# Altium footprint library TranDangKhoa-LIB.PcbLib: 1435 footprints (part 88 of 90)
Each footprint in its own frame and in the unit in brackets; x right, y up, seen from the top. Pads: shape width x height; smd on the part's side, far side on the other; paste and mask are expansions set on the pad; w line width, h text height; cw(c..) or ccw(c..) is an arc to the next point about the centre after c.
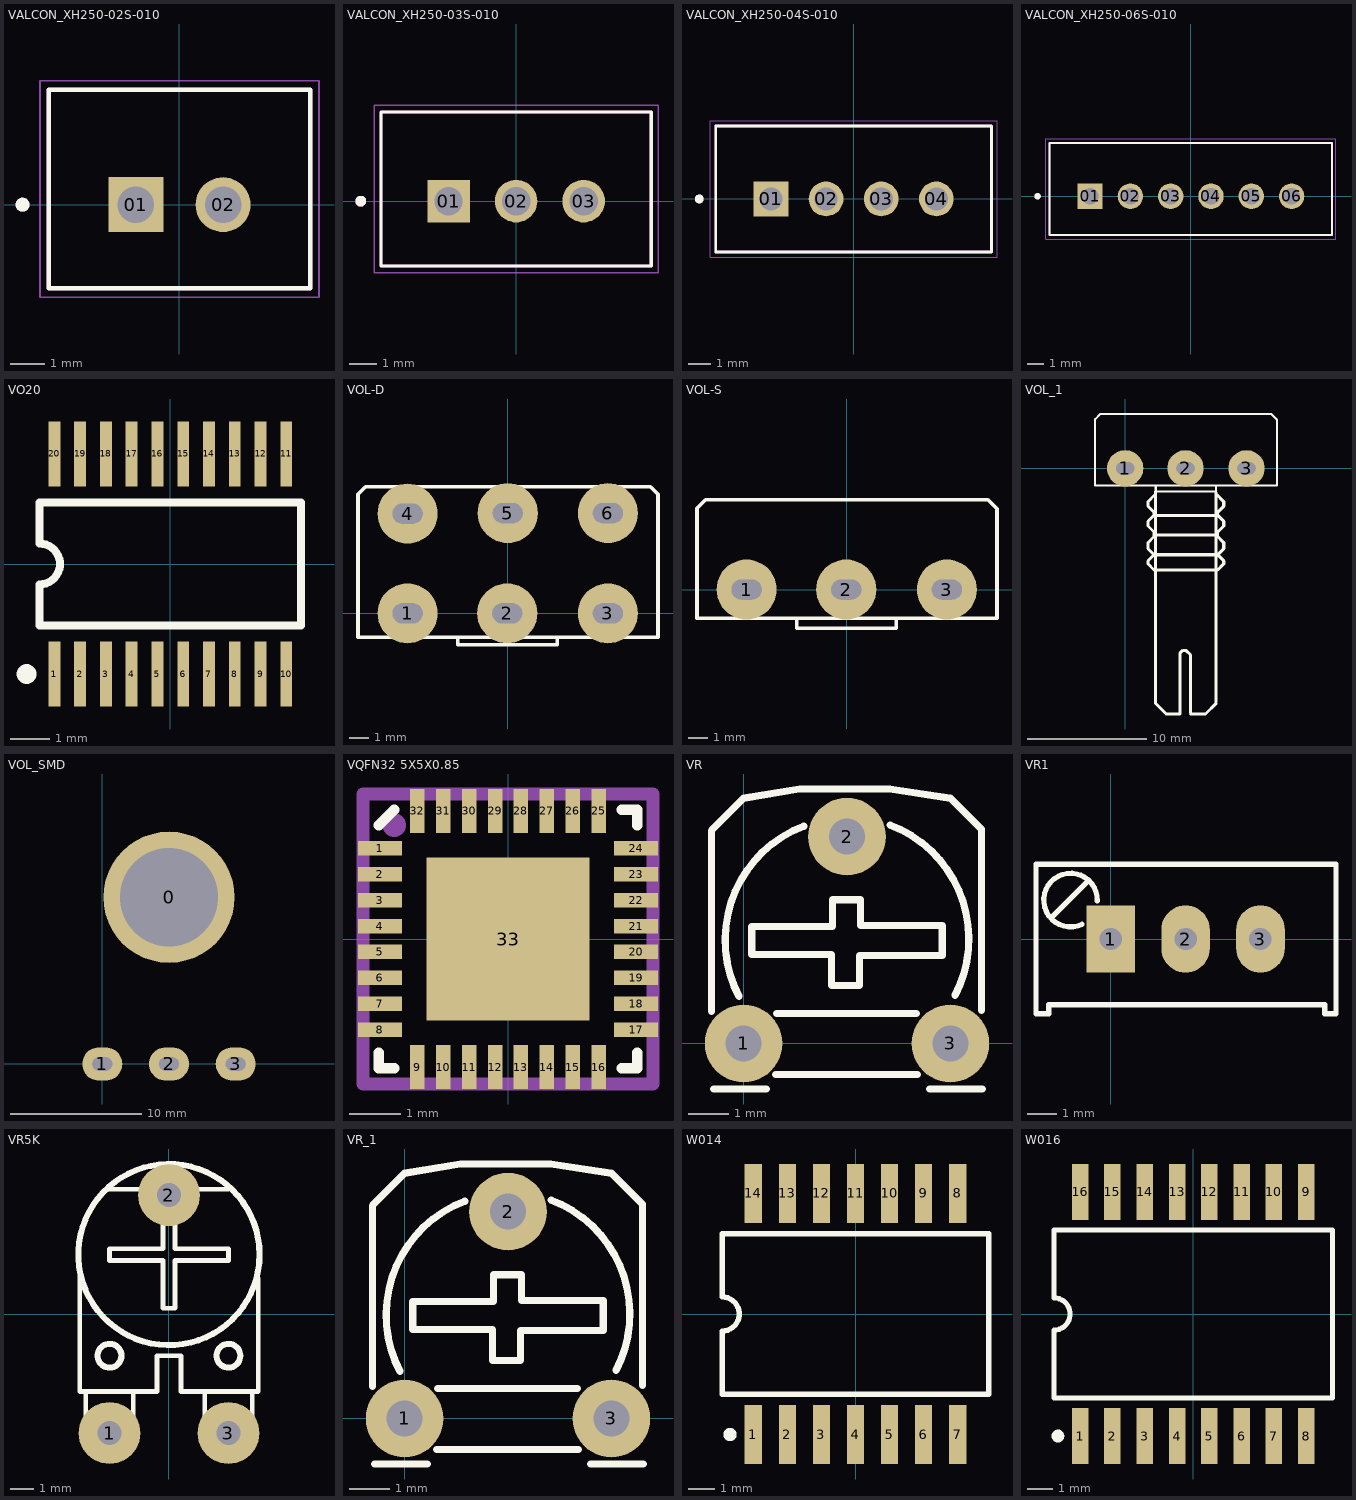
[diagram p87: the footprints below, top view; thin cyan lines are the x and y axes]

## VALCON_XH250-02S-010 [mm]
height 7
pads (2):
  rect 1.575x1.575 / inner round 1.575 / far side rect 1.575x1.575 hole 1.05: 01(-1.25,0)
  round 1.575 hole 1.05: 02(1.25,0)
Top Overlay:
  circle w0.2: c-4.5,0 r0.1
  lines w0.127: -3.75,-2.4 -3.75,3.3 3.75,3.3 3.75,-2.4 -3.75,-2.4
Mechanical 13:
  circle w0.2: c-4.5,0 r0.1
  lines w0.127: -3.75,-2.4 -3.75,3.3 3.75,3.3 3.75,-2.4 -3.75,-2.4
Mechanical 15:
  lines w0.05: -4,-2.65 -4,3.55 4,3.55 4,-2.65 -4,-2.65
3D body "step_temp.STEP": height 7, standoff -3.4, extent -3.75,-2.4 3.75,3.3

## VALCON_XH250-03S-010 [mm]
pads (3):
  rect 1.575x1.575 / inner round 1.575 / far side rect 1.575x1.575 hole 1.05 mask+0.05: 01(-2.5,0)
  round 1.575 hole 1.05 mask+0.05: 02(0,0) 03(2.5,0)
Top Overlay:
  circle w0.2: c-5.75,0 r0.1
  lines w0.127: -5,-2.4 -5,3.3 5,3.3 5,-2.4 -5,-2.4
Mechanical 13:
  circle w0.2: c-5.75,0 r0.1
  lines w0.127: -5,-2.4 -5,3.3 5,3.3 5,-2.4 -5,-2.4
Mechanical 15:
  lines w0.05: -5.25,-2.65 -5.25,3.55 5.25,3.55 5.25,-2.65 -5.25,-2.65

## VALCON_XH250-04S-010 [mm]
pads (4):
  rect 1.575x1.575 / inner round 1.575 / far side rect 1.575x1.575 hole 1.05 mask+0.05: 01(-3.75,0)
  round 1.575 hole 1.05 mask+0.05: 02(-1.25,0) 03(1.25,0) 04(3.75,0)
Top Overlay:
  circle w0.2: c-7,0 r0.1
  lines w0.127: -6.25,-2.4 -6.25,3.3 6.25,3.3 6.25,-2.4 -6.25,-2.4
Mechanical 13:
  circle w0.2: c-7,0 r0.1
  lines w0.127: -6.25,-2.4 -6.25,3.3 6.25,3.3 6.25,-2.4 -6.25,-2.4
Mechanical 15:
  lines w0.05: -6.5,-2.65 -6.5,3.55 6.5,3.55 6.5,-2.65 -6.5,-2.65

## VALCON_XH250-06S-010 [mm]
pads (6):
  rect 1.575x1.575 / inner round 1.575 / far side rect 1.575x1.575 hole 1.05: 01(-6.25,0)
  round 1.575 hole 1.05: 02(-3.75,0) 03(-1.25,0) 04(1.25,0) 05(3.75,0) 06(6.25,0)
Top Overlay:
  circle w0.2: c-9.5,0 r0.1
  lines w0.127: -8.75,-2.4 -8.75,3.3 8.75,3.3 8.75,-2.4 -8.75,-2.4
Mechanical 13:
  circle w0.2: c-9.5,0 r0.1
  lines w0.127: -8.75,-2.4 -8.75,3.3 8.75,3.3 8.75,-2.4 -8.75,-2.4
Mechanical 15:
  lines w0.05: -9,-2.65 -9,3.55 9,3.55 9,-2.65 -9,-2.65
3D body "step_temp.STEP": height 7, standoff -3.4, extent -8.75,-2.4 8.75,3.3

## VO20 [mm] "20-Lead TSOP (VO20)"
height 1.2
pads (20):
  rect 0.3x1.65 smd: 1(-2.925,-2.775) 2(-2.275,-2.775) 3(-1.625,-2.775) 4(-0.975,-2.775) 5(-0.325,-2.775) 6(0.325,-2.775) 7(0.975,-2.775) 8(1.625,-2.775) 9(2.275,-2.775) 10(2.925,-2.775) 11(2.925,2.775) 12(2.275,2.775) 13(1.625,2.775) 14(0.975,2.775) 15(0.325,2.775) 16(-0.325,2.775) 17(-0.975,2.775) 18(-1.625,2.775) 19(-2.275,2.775) 20(-2.925,2.775)
Top Overlay:
  circle w0.25: c-3.625,-2.775 r0.125
  lines w0.2: -3.3,-1.55 3.3,-1.55 3.3,1.55 -3.3,1.55 -3.3,0.517 cw(c-3.3,0) -3.3,-0.517 -3.3,-1.55

## VOL-D [mil] "Volume control Dual"
height 400
pads (6):
  round 120 hole 40 slot 60 at 0 deg: 1(-200,0) 2(-1,0) 3(200,0) 4(-200,199) 5(0,200) 6(200,200)
Top Overlay:
  lines w7: -100,-48 -100,-63 99,-63 99,-48 ; -299,-48 300,-48 300,238 285,253 -284,253 -299,238 -299,-48
3D body "SW3dPS-ALPHA-potentiometer stereo PCB mount.STEP": height 834.65, standoff -129.92, extent -338.65,-1309.27 330.65,299

## VOL-S [mil] "Volume control single"
height 400
pads (3):
  round 120 hole 40 slot 60 at 0 deg: 1(-200,0) 2(-1,0) 3(200,0)
Top Overlay:
  lines w7: -100,-57 -100,-77 99,-77 99,-57 ; -299,-57 -299,162 -282,179 282,179 300,161 300,-57 -299,-57

## VOL_1 [mil]
pads (3):
  round 120 hole 40 slot 60 at 0 deg: 1(0,0) 2(199,0) 3(400,0)
Top Overlay:
  lines w7: 100,-57 100,-77 299,-77 299,-57 ; 101,-77 101,-57 ; -99,-57 500,-57 500,161 482,179 -82,179 -99,162 -99,-57
  lines w10: 95,-335 75,-315 75,-305 95,-285 75,-265 75,-245 95,-225 95,-210 75,-190 75,-175 95,-155 95,-145 75,-125 75,-110 100,-85 ; 95,-220 300,-220 ; 100,-770 100,-77 ; 100,-760 100,-775 135,-810 180,-810 180,-610 190,-600 200,-600 215,-615 215,-805 ; 100,-335 305,-335 325,-315 325,-305 305,-285 ; 100,-285 305,-285 ; 105,-155 300,-155 ; 215,-810 265,-810 300,-775 ; 300,-770 300,-80 ; 300,-85 325,-110 325,-125 305,-145 305,-155 325,-175 325,-190 305,-210 305,-225 325,-245 325,-265 305,-285
3D body "SW3dPS-Pot.STEP": height 839.35, standoff -130, extent -110,-818.11 510,188.11

## VOL_SMD [mil]
pads (4):
  round 393.7 hole 295.28: 0(200,500)
  oval 120x100 hole 40 slot 60 at 0 deg: 1(0,0) 2(200,0) 3(400,0)
Bottom Overlay:
  circle w12: c400,150 r50
  circle w12: c200,150 r50
  circle w12: c0,150 r50
  circle w12: c200,500 r215.01
  lines w12: -57.25,301.71 cw(c200,500) 455.57,299.55 ; -55,299 127,299 ; -49,700 119,700 ; 281,298 455,298 ; 286,698 454,698 ; 455,295 500,250 500,-75 -100,-75 -100,255 ; -100,255 -55,300 -100,255
3D body "SW3dPS-omeg pot.STEP": height 866.14, standoff -407.48, extent -203.15,-247.08 600,947.08

## VQFN32 5X5X0.85 [mm] "Creator MM"
pads (33):
  rect 0.85x0.28 smd mask+0.025: 1(-2.475,1.75) 2(-2.475,1.25) 3(-2.475,0.75) 4(-2.475,0.25) 5(-2.475,-0.25) 6(-2.475,-0.75) 7(-2.475,-1.25) 8(-2.475,-1.75) 17(2.475,-1.75) 18(2.475,-1.25) 19(2.475,-0.75) 20(2.475,-0.25) 21(2.475,0.25) 22(2.475,0.75) 23(2.475,1.25) 24(2.475,1.75)
  rect 0.28x0.85 smd mask+0.025: 9(-1.75,-2.475) 10(-1.25,-2.475) 11(-0.75,-2.475) 12(-0.25,-2.475) 13(0.25,-2.475) 14(0.75,-2.475) 15(1.25,-2.475) 16(1.75,-2.475) 25(1.75,2.475) 26(1.25,2.475) 27(0.75,2.475) 28(0.25,2.475) 29(-0.25,2.475) 30(-0.75,2.475) 31(-1.25,2.475) 32(-1.75,2.475)
  rect 3.15x3.15 smd paste-10 mask+0.025: 33(0,0)
Top Overlay:
  lines w0.2: -2.5,-2.2 -2.5,-2.5 -2.2,-2.5 ; -2.5,2.2 -2.2,2.5 ; 2.2,-2.5 2.5,-2.5 2.5,-2.2 ; 2.2,2.5 2.5,2.5 2.5,2.2
Top Paste:
  rectangle: -1.5,0.1 -0.1,1.5
  region: 0.1,1.5 0.1,0.1 1.5,0.1 1.5,1.5
  region: -0.1,-1.5 -0.1,-0.1 -1.5,-0.1 -1.5,-1.5
  region: 1.5,-0.1 0.1,-0.1 0.1,-1.5 1.5,-1.5
Mechanical 16:
  circle w0.254: c-2.2,2.2 r0.1
  lines w0.254: -2.8,-2.8 -2.8,2.8 2.8,2.8 2.8,-2.8 -2.8,-2.8
Mechanical 29:
  text ".Designator" at -0.6,1 h1.2
3D body: height 0.9, standoff 0, extent -2.5,-2.5 2.5,2.5

## VR [mil] "Resistor Variable"
height 200
pads (3):
  round 75 hole 35: 1(0,0) 2(100,200) 3(200,0)
Top Overlay:
  lines w7: -31,31 -31,206 0,237 54,246 141.5,246 200,237 230,207 230,32 ; -29,-44 22,-44 ; -4.35,45.34 cw(c100,100) 58.1,210.1 ; 8,113 8,86 85,86 85,56 112,56 112,85 192,85 192,114 113,114 113,139 86,139 86,113 9,113 ; 31,-30 168,-30 ; 32,29 167,29 ; 141.9,211.1 cw(c100,101) 204.35,46.34 ; 180,-44 231,-44
3D body "SW3dPS-Trimpot Horizontal.STEP": height 165.35, standoff -220.47, extent -86.85,-30 306.85,371.57

## VR1 [mil] "Variable Resistor"
height 400
pads (3):
  rect 65x90 hole 30: 1(0,0)
  oval 65x90 hole 30: 2(100,0) 3(200,0)
Top Overlay:
  lines w7: -80,28 -30,78 ; -38.6,19.63 cw(c-53.79,52.05) -18.01,50.77 ; -100,-100 -83,-100 -83,-88 286,-88 286,-100 301,-100 301,100 -100,100 -100,-100
3D body "SW3dPS-Bourns_3299W.STEP": height 455, standoff -45, extent -87.5,-130 287.5,110

## VR5K [mm]
pads (3):
  round 2.6 hole 1 paste-2539.97: 1(-2.5,-5) 2(0,5) 3(2.5,-5)
Top Overlay:
  circle w0.254: c0,2.5 r3.808
  circle w0.254: c2.5,-1.75 r0.5
  circle w0.254: c-2.5,-1.75 r0.5
  lines w0.2: -3.75,1.75 -3.75,-3.25 -0.5,-3.25 -0.5,-1.75 0.5,-1.75 0.5,-3.25 3.75,-3.25 3.75,1.5 ; -3.5,-4.25 -3.5,-3.25 ; -2.5,5.25 2.5,5.25 ; -1.5,-4.75 -1.5,-3.25 ; 1.5,-4.75 1.5,-3.25 ; 3.5,-4.75 3.5,-3.25 ; -2.5,2.25 -0.25,2.25 -0.25,0.25 0.25,0.25 0.25,2.25 2.5,2.25 2.5,2.75 0.25,2.75 0.25,4.75 -0.25,4.75 -0.25,2.75 -2.5,2.75 -2.5,2.25
3D body "VR-1-3D.STEP": height 7.62, standoff -2.54, extent -4.318,-5.045 4.318,5.75

## VR_1 [mil] "Resistor Variable"
height 200
pads (3):
  round 75 hole 35: 1(0,0) 2(100,200) 3(200,0)
Top Overlay:
  lines w7: -31,31 -31,206 0,237 54,246 141.5,246 200,237 230,207 230,32 ; -29,-44 22,-44 ; -4.35,45.34 cw(c100,100) 58.1,210.1 ; 8,113 8,86 85,86 85,56 112,56 112,85 192,85 192,114 113,114 113,139 86,139 86,113 9,113 ; 31,-30 168,-30 ; 32,29 167,29 ; 141.9,211.1 cw(c100,101) 204.35,46.34 ; 180,-44 231,-44
3D body "User Library-Trimmer varistor-1.STEP": height 300, standoff -119.49, extent -34.05,-86.98 234.06,237.89

## W014 [mm] "DFP; 14 Leads; Body 9.9 x 6.6 mm (LxW max); Pitch 1.27 mm"
height 2.03
pads (14):
  rect 0.65x2.2 smd: 1(-3.81,-4.5) 2(-2.54,-4.5) 3(-1.27,-4.5) 4(0,-4.5) 5(1.27,-4.5) 6(2.54,-4.5) 7(3.81,-4.5) 8(3.81,4.5) 9(2.54,4.5) 10(1.27,4.5) 11(0,4.5) 12(-1.27,4.5) 13(-2.54,4.5) 14(-3.81,4.5)
Top Overlay:
  circle w0.25: c-4.685,-4.5 r0.125
  lines w0.2: -4.975,-3 4.975,-3 4.975,3 -4.975,3 -4.975,0.635 cw(c-4.975,0) -4.975,-0.635 -4.975,-3

## W016 [mm] "DFP; 16 Leads; Body 10.9 x 7.2 mm (LxW max); Pitch 1.27 mm"
height 2.03
pads (16):
  rect 0.65x2.2 smd: 1(-4.445,-4.8) 2(-3.175,-4.8) 3(-1.905,-4.8) 4(-0.635,-4.8) 5(0.635,-4.8) 6(1.905,-4.8) 7(3.175,-4.8) 8(4.445,-4.8) 9(4.445,4.8) 10(3.175,4.8) 11(1.905,4.8) 12(0.635,4.8) 13(-0.635,4.8) 14(-1.905,4.8) 15(-3.175,4.8) 16(-4.445,4.8)
Top Overlay:
  circle w0.25: c-5.32,-4.8 r0.125
  lines w0.2: -5.475,-3.3 5.475,-3.3 5.475,3.3 -5.475,3.3 -5.475,0.635 cw(c-5.475,0) -5.475,-0.635 -5.475,-3.3